# Altium footprint library Connector.PcbLib: 65 footprints (part 2 of 5)
Each footprint in its own frame and in the unit in brackets; x right, y up, seen from the top. Pads: shape width x height; smd on the part's side, far side on the other; paste and mask are expansions set on the pad; w line width, h text height; cw(c..) or ccw(c..) is an arc to the next point about the centre after c.
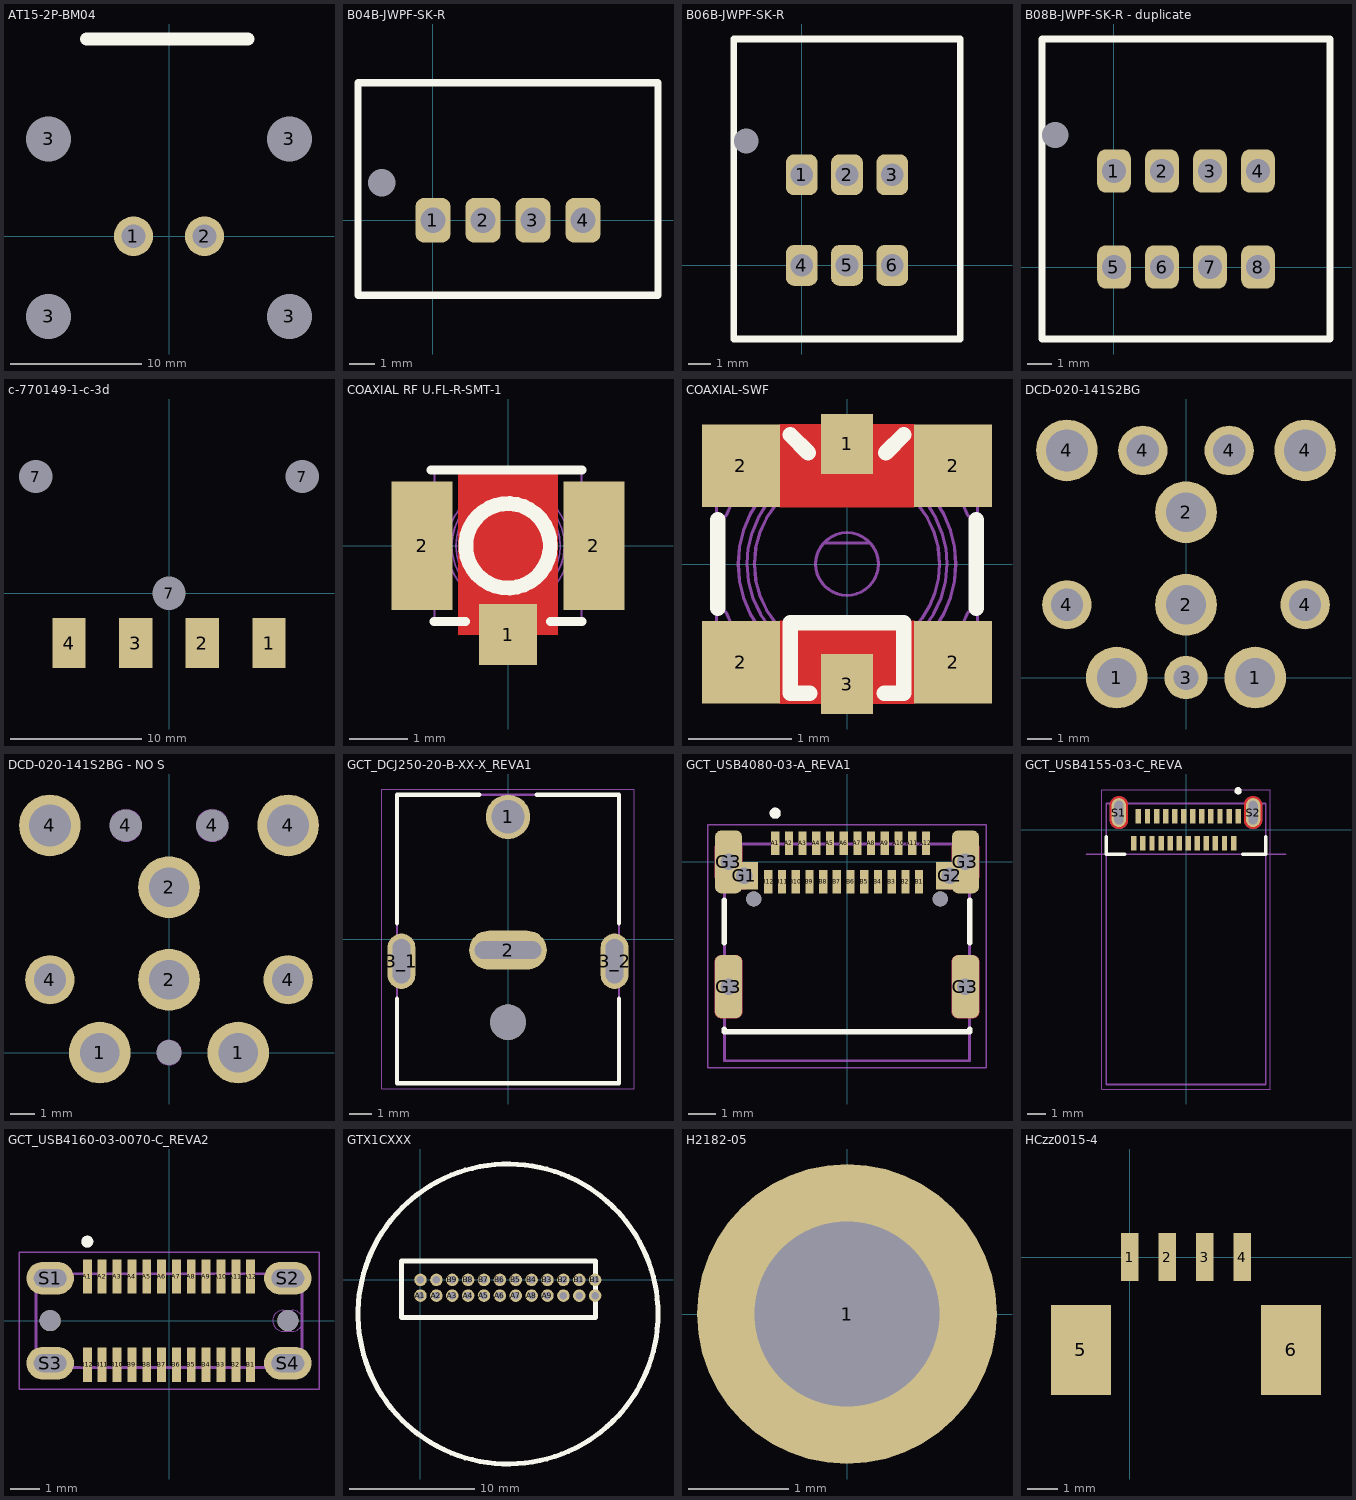
[diagram p1: the footprints below, top view; thin cyan lines are the x and y axes]

## AT15-2P-BM04 [mm] "2 POSITION STRAIGHT FLANGE MOUNT PCB RECEPTACLE, POTTED, TIN PLATED CONTACTS INCLUDED. COMPARABLE TO PN# DT15-2P-P010"
pads (6):
  round 3 hole 1.8: 1(-2.7,0) 2(2.7,0)
  round 3 hole 3.43 unplated: 3(-9.155,-6.1) 3(-9.155,7.41) 3(9.155,-6.1) 3(9.155,7.41)
Top Overlay:
  lines w1: -6.25,15 6,15
3D body "AT15-2P-BM04.stp": height 30.8, standoff -1.83, extent -17.591,-13.049 17.609,14.351

## B04B-JWPF-SK-R [mm] "JST 2x5 Automotive"
pads (5):
  rrect50% 1.4x1.8 hole 1: 1(0,0) 2(2,0) 3(4,0) 4(6,0)
  round 0 hole 1.1 unplated: 10(-2.05,1.5)
Top Overlay:
  lines w0.3: -3,-3 9,-3 9,5.5 -3,5.5 -3,-3
3D body "B04B-JWPF-SK-R.STEP": height 17, standoff -2.9, extent -2.501,-2.863 8.499,5.537

## B06B-JWPF-SK-R [mm] "JST 2x5 Automotive"
pads (7):
  rrect50% 1.4x1.8 hole 1: 1(0,4) 2(2,4) 3(4,4) 4(0,0) 5(2,0) 6(4,0)
  round 0 hole 1.1 unplated: 10(-2.45,5.5)
Top Overlay:
  lines w0.3: -3,-3.25 7,-3.25 7,10 -3,10 -3,-3.25
3D body "B06B-JWPF-SK-R.STEP": height 16.6, standoff -3.3, extent -2.879,-3.052 6.921,9.748

## B08B-JWPF-SK-R - duplicate [mm] "JST 2x5 Automotive"
pads (9):
  rrect50% 1.4x1.8 hole 1: 1(0,4) 2(2,4) 3(4,4) 4(6,4) 5(0,0) 6(2,0) 7(4,0) 8(6,0)
  round 0 hole 1.1 unplated: 10(-2.45,5.5)
Top Overlay:
  lines w0.3: -3,-3 -3,9.5 9,9.5 9,-3 -3,-3
3D body "B08B-JWPF-SK-R.STEP": height 16.6, standoff -3.3, extent -2.909,-3.037 8.891,9.463

## c-770149-1-c-3d [mil] "4 Pin drive power SMD"
pads (7):
  rect 100x150 smd: 1(300,-150) 2(100,-150) 3(-100,-150) 4(-300,-150)
  round 60 hole 100 unplated: 7(-400,350) 7(0,0) 7(400,350)
3D body "c-770149-1-c-3d.stp": height 347.6, standoff -165.4, extent -500,-201.4 500,403.54

## COAXIAL RF U.FL-R-SMT-1 [mm]
pads (3):
  rect 1x1.05 smd: 1(0,-1.525)
  rect 1.05x2.2 smd: 2(-1.475,0) 2(1.475,0)
Top Layer:
  pour cut-out: 0.85,1.3 -0.85,1.3 -0.85,-1.525 0.85,-1.525
Top Overlay:
  circle w0.254: c0,0 r0.725
  lines w0: 0.725,1.3 1.275,1.3
  lines w0.152: -1.325,1.3 1.275,1.3 ; -1.275,-1.3 -0.725,-1.3 ; 0.725,-1.3 1.275,-1.3
Mechanical 7:
  drawing of 206 lines, arcs and shapes, not listed
  text ".Designator" at 0,0 h0.38
3D body "U.FL-R-SMT-1.stp": height 1.25, standoff 0, extent -1.5,-1.6 1.5,1.5

## COAXIAL-SWF [mm]
pads (6):
  rect 0.5x0.58 smd: 1(0,1.16) 3(0,-1.16)
  rect 0.75x0.8 smd: 2(-1.025,-0.95) 2(-1.025,0.95) 2(1.025,-0.95) 2(1.025,0.95)
Top Layer:
  pour cut-out: -0.65,0.55 0.65,0.55 0.65,1.35 -0.65,1.35
  pour cut-out: 0.65,-0.55 -0.65,-0.55 -0.65,-1.35 0.65,-1.35
Top Overlay:
  lines w0.15: -1.25,-0.43 -1.25,0.43 ; -0.55,1.25 -0.375,1.075 ; -0.36,-1.25 -0.55,-1.25 -0.55,-0.57 0.55,-0.57 0.55,-1.25 0.36,-1.25 ; 0.375,1.075 0.55,1.25 ; 1.25,-0.43 1.25,0.43
Mechanical 7:
  drawing of 206 lines, arcs and shapes, not listed
3D body: height 1.55, standoff 1.25, extent -1.05,-1.05 1.05,1.05
3D body: height 1.25, standoff 0.95, extent -1.05,-1.049 1.05,1.05
3D body: height 0.9, standoff 0.6, extent -1.05,-1.049 1.05,1.05
3D body: height 0.55, standoff 0.1, extent -1.262,-1.252 1.262,1.253
3D body: height 0.6, standoff 0, extent -1.262,0.655 -0.757,1.248
3D body: height 0.6, standoff 0, extent -1.262,-1.25 -0.757,-0.649
3D body: height 0.6, standoff 0, extent 0.757,-1.246 1.262,-0.653
3D body: height 0.6, standoff 0, extent 0.757,0.655 1.262,1.249
3D body: height 0.95, standoff 0.75, extent -1,-0.999 1,1.001
3D body: height 0.75, standoff 0.6, extent -1.05,-1.049 1.05,1.05
3D body: height 1.4, standoff 0.6, extent -0.9,-0.9 0.9,0.901
3D body: height 0.6, standoff 0.55, extent -1.262,-1.248 1.262,1.251
3D body: height 0.15, standoff 0, extent -0.227,0.899 0.227,1.299
3D body: height 0.15, standoff 0, extent -0.227,-1.301 0.227,-0.758

## DCD-020-141S2BG [mm]
pads (11):
  round 2.5 hole 1.6: 1(-2.801,0) 1(2.802,0) 2(0,2.95) 2(0,6.7)
  round 1.75 hole 1: 3(0,0)
  round 2 hole 1.3: 4(-4.825,2.95) 4(-1.75,9.2) 4(1.75,9.2) 4(4.825,2.95)
  round 2.5 hole 1.7: 4(-4.825,9.2) 4(4.825,9.2)
Mechanical 1:
  circle w0.013: c4.825,9.2 r0.85
  circle w0.013: c-1.75,9.2 r0.65
  circle w0.013: c1.75,9.2 r0.65
  circle w0.013: c0,6.7 r0.8
  circle w0.013: c-2.801,0 r0.8
  circle w0.013: c0,0 r0.5
  circle w0.013: c2.802,0 r0.8
  circle w0.013: c4.825,2.95 r0.65
  circle w0.013: c-4.825,2.95 r0.65
  circle w0.013: c-4.825,9.2 r0.85
  circle w0.013: c0,2.95 r0.8
3D body "DCD-020-141S2.step": height 11, standoff -1.3, extent -5,-0.4 5,11.9

## DCD-020-141S2BG - NO S [mm]
pads (11):
  round 2.5 hole 1.6: 1(-2.801,0) 1(2.802,0) 2(0,2.95) 2(0,6.7)
  round 0 hole 1 unplated: 3(0,0)
  round 2 hole 1.3: 4(-4.825,2.95) 4(4.825,2.95)
  round 2.5 hole 1.7: 4(-4.825,9.2) 4(4.825,9.2)
  round 1 hole 1.3 unplated: 4(-1.75,9.2) 4(1.75,9.2)
Mechanical 1:
  circle w0.013: c4.825,9.2 r0.85
  circle w0.013: c-1.75,9.2 r0.65
  circle w0.013: c1.75,9.2 r0.65
  circle w0.013: c0,6.7 r0.8
  circle w0.013: c-2.801,0 r0.8
  circle w0.013: c0,0 r0.5
  circle w0.013: c2.802,0 r0.8
  circle w0.013: c4.825,2.95 r0.65
  circle w0.013: c-4.825,2.95 r0.65
  circle w0.013: c-4.825,9.2 r0.85
  circle w0.013: c0,2.95 r0.8
3D body "DCD-020-141S2.step": height 11, standoff -1.3, extent -5,-0.4 5,11.9

## GCT_DCJ250-20-B-XX-X_REVA1 [mm]
pads (5):
  round 2 hole 1.5: 1(0,5.5)
  oval 3.5x1.75 hole 0.8 slot 3 at 0 deg: 2(0,-0.5)
  oval 1.25x2.5 hole 0.8 slot 2 at 90 deg: 3_1(-4.8,-1) 3_2(4.8,-1)
  round 1.6 hole 1.6 unplated: ""(0,-3.75)
Top Overlay:
  lines w0.2: -5,-2.7 -5,-6.5 5,-6.5 5,-2.7 ; -5,0.7 -5,6.5 -1.3,6.5 ; 1.3,6.5 5,6.5 5,0.7
Mechanical 13:
  lines w0.1: -5,-6.5 -5,6.5 5,6.5 5,-6.5 -5,-6.5
Mechanical 15:
  lines w0.05: -5.68,-6.756 -5.68,6.756 5.68,6.756 5.68,-6.756 -5.68,-6.756
3D body "dcj250-20-b-k1-a.stp": height 10, standoff -2.2, extent -5.193,-6.6 5.2,6.4

## GCT_USB4080-03-A_REVA1 [mm]
height 3.16
pads (32):
  rect 0.3x0.85 smd: A1(-2.62,0.675) A2(-2.12,0.675) A3(-1.62,0.675) A4(-1.12,0.675) A5(-0.62,0.675) A6(-0.12,0.675) A7(0.38,0.675) A8(0.88,0.675) A9(1.38,0.675) A10(1.88,0.675) A11(2.38,0.675) A12(2.88,0.675) B1(2.63,-0.725) B2(2.13,-0.725) B3(1.63,-0.725) B4(1.13,-0.725) B5(0.63,-0.725) B6(0.13,-0.725) B7(-0.37,-0.725) B8(-0.87,-0.725) B9(-1.37,-0.725) B10(-1.87,-0.725) B11(-2.37,-0.725) B12(-2.87,-0.725)
  rect 1x1 hole 0.6 square: G1(-3.75,-0.5) G2(3.75,-0.5)
  rrect50% 1x2.3 hole 0.6 square: G3(-4.32,-4.55) G3(-4.32,0) G3(4.32,-4.55) G3(4.32,0)
  round 0.55 hole 0.55 unplated: ""(-3.4,-1.35) ""(3.4,-1.35)
Top Layer:
  region: 182 vertices and 0 holes, not listed, extent -4.82,-1 -3.28,1
  region: 180 vertices and 0 holes, not listed, extent 3.28,-1 4.82,0.99
  region: 4.596,-3.401 4.609,-3.403 4.622,-3.405 4.635,-3.409 4.647,-3.412 4.66,-3.417 4.672,-3.422 4.683,-3.427 4.695,-3.433 4.706,-3.44 4.717,-3.448 4.727,-3.456 4.737,-3.464 4.747,-3.473 4.756,-3.483 4.764,-3.493 4.772,-3.503 4.78,-3.514 4.787,-3.525 4.793,-3.537 4.798,-3.548 4.803,-3.56 4.808,-3.573 4.811,-3.585 4.815,-3.598 4.817,-3.611 4.819,-3.624 4.82,-3.637 4.82,-3.65 4.82,-5.45 4.82,-5.463 4.819,-5.476 4.817,-5.489 4.815,-5.502 4.811,-5.515 4.808,-5.527 4.803,-5.54 4.798,-5.552 4.793,-5.563 4.787,-5.575 4.78,-5.586 4.772,-5.597 4.764,-5.607 4.756,-5.617 4.747,-5.627 4.737,-5.636 4.727,-5.644 4.717,-5.652 4.706,-5.66 4.695,-5.667 4.683,-5.673 4.672,-5.678 4.66,-5.683 4.647,-5.688 4.635,-5.691 4.622,-5.695 4.609,-5.697 4.596,-5.699 4.583,-5.7 4.057,-5.7 4.044,-5.699 4.031,-5.697 4.018,-5.695 4.005,-5.691 3.993,-5.688 3.98,-5.683 3.968,-5.678 3.957,-5.673 3.945,-5.667 3.934,-5.66 3.923,-5.652 3.913,-5.644 3.903,-5.636 3.893,-5.627 3.884,-5.617 3.876,-5.607 3.868,-5.597 3.86,-5.586 3.853,-5.575 3.847,-5.563 3.842,-5.552 3.837,-5.54 3.832,-5.527 3.829,-5.515 3.825,-5.502 3.823,-5.489 3.821,-5.476 3.82,-5.463 3.82,-5.45 3.82,-3.65 3.82,-3.637 3.821,-3.624 3.823,-3.611 3.825,-3.598 3.829,-3.585 3.832,-3.573 3.837,-3.56 3.842,-3.548 3.847,-3.537 3.853,-3.525 3.86,-3.514 3.868,-3.503 3.876,-3.493 3.884,-3.483 3.893,-3.473 3.903,-3.464 3.913,-3.456 3.923,-3.448 3.934,-3.44 3.945,-3.433 3.957,-3.427 3.968,-3.422 3.98,-3.417 3.993,-3.412 4.005,-3.409 4.018,-3.405 4.031,-3.403 4.044,-3.401 4.057,-3.4 4.583,-3.4
  region: -4.044,-3.401 -4.031,-3.403 -4.018,-3.405 -4.005,-3.409 -3.993,-3.412 -3.98,-3.417 -3.968,-3.422 -3.957,-3.427 -3.945,-3.433 -3.934,-3.44 -3.923,-3.448 -3.913,-3.456 -3.903,-3.464 -3.893,-3.473 -3.884,-3.483 -3.876,-3.493 -3.868,-3.503 -3.86,-3.514 -3.853,-3.525 -3.847,-3.537 -3.842,-3.548 -3.837,-3.56 -3.832,-3.573 -3.829,-3.585 -3.825,-3.598 -3.823,-3.611 -3.821,-3.624 -3.82,-3.637 -3.82,-3.65 -3.82,-5.45 -3.82,-5.463 -3.821,-5.476 -3.823,-5.489 -3.825,-5.502 -3.829,-5.515 -3.832,-5.527 -3.837,-5.54 -3.842,-5.552 -3.847,-5.563 -3.853,-5.575 -3.86,-5.586 -3.868,-5.597 -3.876,-5.607 -3.884,-5.617 -3.893,-5.627 -3.903,-5.636 -3.913,-5.644 -3.923,-5.652 -3.934,-5.66 -3.945,-5.667 -3.957,-5.673 -3.968,-5.678 -3.98,-5.683 -3.993,-5.688 -4.005,-5.691 -4.018,-5.695 -4.031,-5.697 -4.044,-5.699 -4.057,-5.7 -4.583,-5.7 -4.596,-5.699 -4.609,-5.697 -4.622,-5.695 -4.635,-5.691 -4.647,-5.688 -4.66,-5.683 -4.672,-5.678 -4.683,-5.673 -4.695,-5.667 -4.706,-5.66 -4.717,-5.652 -4.727,-5.644 -4.737,-5.636 -4.747,-5.627 -4.756,-5.617 -4.764,-5.607 -4.772,-5.597 -4.78,-5.586 -4.787,-5.575 -4.793,-5.563 -4.798,-5.552 -4.803,-5.54 -4.808,-5.527 -4.811,-5.515 -4.815,-5.502 -4.817,-5.489 -4.819,-5.476 -4.82,-5.463 -4.82,-5.45 -4.82,-3.65 -4.82,-3.637 -4.819,-3.624 -4.817,-3.611 -4.815,-3.598 -4.811,-3.585 -4.808,-3.573 -4.803,-3.56 -4.798,-3.548 -4.793,-3.537 -4.787,-3.525 -4.78,-3.514 -4.772,-3.503 -4.764,-3.493 -4.756,-3.483 -4.747,-3.473 -4.737,-3.464 -4.727,-3.456 -4.717,-3.448 -4.706,-3.44 -4.695,-3.433 -4.683,-3.427 -4.672,-3.422 -4.66,-3.417 -4.647,-3.412 -4.635,-3.409 -4.622,-3.405 -4.609,-3.403 -4.596,-3.401 -4.583,-3.4 -4.057,-3.4
Bottom Layer:
  region: 182 vertices and 0 holes, not listed, extent -4.82,-1 -3.28,1
  region: 180 vertices and 0 holes, not listed, extent 3.28,-1 4.82,0.99
  region: -4.044,-3.401 -4.031,-3.403 -4.018,-3.405 -4.005,-3.409 -3.993,-3.412 -3.98,-3.417 -3.968,-3.422 -3.957,-3.427 -3.945,-3.433 -3.934,-3.44 -3.923,-3.448 -3.913,-3.456 -3.903,-3.464 -3.893,-3.473 -3.884,-3.483 -3.876,-3.493 -3.868,-3.503 -3.86,-3.514 -3.853,-3.525 -3.847,-3.537 -3.842,-3.548 -3.837,-3.56 -3.832,-3.573 -3.829,-3.585 -3.825,-3.598 -3.823,-3.611 -3.821,-3.624 -3.82,-3.637 -3.82,-3.65 -3.82,-5.45 -3.82,-5.463 -3.821,-5.476 -3.823,-5.489 -3.825,-5.502 -3.829,-5.515 -3.832,-5.527 -3.837,-5.54 -3.842,-5.552 -3.847,-5.563 -3.853,-5.575 -3.86,-5.586 -3.868,-5.597 -3.876,-5.607 -3.884,-5.617 -3.893,-5.627 -3.903,-5.636 -3.913,-5.644 -3.923,-5.652 -3.934,-5.66 -3.945,-5.667 -3.957,-5.673 -3.968,-5.678 -3.98,-5.683 -3.993,-5.688 -4.005,-5.691 -4.018,-5.695 -4.031,-5.697 -4.044,-5.699 -4.057,-5.7 -4.583,-5.7 -4.596,-5.699 -4.609,-5.697 -4.622,-5.695 -4.635,-5.691 -4.647,-5.688 -4.66,-5.683 -4.672,-5.678 -4.683,-5.673 -4.695,-5.667 -4.706,-5.66 -4.717,-5.652 -4.727,-5.644 -4.737,-5.636 -4.747,-5.627 -4.756,-5.617 -4.764,-5.607 -4.772,-5.597 -4.78,-5.586 -4.787,-5.575 -4.793,-5.563 -4.798,-5.552 -4.803,-5.54 -4.808,-5.527 -4.811,-5.515 -4.815,-5.502 -4.817,-5.489 -4.819,-5.476 -4.82,-5.463 -4.82,-5.45 -4.82,-3.65 -4.82,-3.637 -4.819,-3.624 -4.817,-3.611 -4.815,-3.598 -4.811,-3.585 -4.808,-3.573 -4.803,-3.56 -4.798,-3.548 -4.793,-3.537 -4.787,-3.525 -4.78,-3.514 -4.772,-3.503 -4.764,-3.493 -4.756,-3.483 -4.747,-3.473 -4.737,-3.464 -4.727,-3.456 -4.717,-3.448 -4.706,-3.44 -4.695,-3.433 -4.683,-3.427 -4.672,-3.422 -4.66,-3.417 -4.647,-3.412 -4.635,-3.409 -4.622,-3.405 -4.609,-3.403 -4.596,-3.401 -4.583,-3.4 -4.057,-3.4
  region: 4.596,-3.401 4.609,-3.403 4.622,-3.405 4.635,-3.409 4.647,-3.412 4.66,-3.417 4.672,-3.422 4.683,-3.427 4.695,-3.433 4.706,-3.44 4.717,-3.448 4.727,-3.456 4.737,-3.464 4.747,-3.473 4.756,-3.483 4.764,-3.493 4.772,-3.503 4.78,-3.514 4.787,-3.525 4.793,-3.537 4.798,-3.548 4.803,-3.56 4.808,-3.573 4.811,-3.585 4.815,-3.598 4.817,-3.611 4.819,-3.624 4.82,-3.637 4.82,-3.65 4.82,-5.45 4.82,-5.463 4.819,-5.476 4.817,-5.489 4.815,-5.502 4.811,-5.515 4.808,-5.527 4.803,-5.54 4.798,-5.552 4.793,-5.563 4.787,-5.575 4.78,-5.586 4.772,-5.597 4.764,-5.607 4.756,-5.617 4.747,-5.627 4.737,-5.636 4.727,-5.644 4.717,-5.652 4.706,-5.66 4.695,-5.667 4.683,-5.673 4.672,-5.678 4.66,-5.683 4.647,-5.688 4.635,-5.691 4.622,-5.695 4.609,-5.697 4.596,-5.699 4.583,-5.7 4.057,-5.7 4.044,-5.699 4.031,-5.697 4.018,-5.695 4.005,-5.691 3.993,-5.688 3.98,-5.683 3.968,-5.678 3.957,-5.673 3.945,-5.667 3.934,-5.66 3.923,-5.652 3.913,-5.644 3.903,-5.636 3.893,-5.627 3.884,-5.617 3.876,-5.607 3.868,-5.597 3.86,-5.586 3.853,-5.575 3.847,-5.563 3.842,-5.552 3.837,-5.54 3.832,-5.527 3.829,-5.515 3.825,-5.502 3.823,-5.489 3.821,-5.476 3.82,-5.463 3.82,-5.45 3.82,-3.65 3.82,-3.637 3.821,-3.624 3.823,-3.611 3.825,-3.598 3.829,-3.585 3.832,-3.573 3.837,-3.56 3.842,-3.548 3.847,-3.537 3.853,-3.525 3.86,-3.514 3.868,-3.503 3.876,-3.493 3.884,-3.483 3.893,-3.473 3.903,-3.464 3.913,-3.456 3.923,-3.448 3.934,-3.44 3.945,-3.433 3.957,-3.427 3.968,-3.422 3.98,-3.417 3.993,-3.412 4.005,-3.409 4.018,-3.405 4.031,-3.403 4.044,-3.401 4.057,-3.4 4.583,-3.4
Top Overlay:
  circle w0.2: c-2.62,1.775 r0.1
  lines w0.2: -4.47,-6.1 -4.47,-6.2 4.47,-6.2 4.47,-6.1 ; -4.47,-2.95 -4.47,-1.4 ; 4.47,-2.95 4.47,-1.4
Top Solder:
  drawing of 4 lines, arcs and shapes, not listed
Bottom Solder:
  drawing of 4 lines, arcs and shapes, not listed
Mechanical 1:
  lines w0: 4,-0.2 ccw(c4.005,-0.185) 4.02,-0.19 4.02,0.5 cw(c4.32,0.5) 4.32,0.8 cw(c4.32,0.5) 4.62,0.5 4.62,-0.5 cw(c4.32,-0.5) 4.32,-0.8 3.72,-0.8 cw(c3.72,-0.5) 3.42,-0.5 cw(c3.72,-0.5) 3.72,-0.2 4,-0.2 ; -4.62,-5.35 ccw(c-4.47,-5.35) -4.47,-5.5 -4.17,-5.5 ccw(c-4.17,-5.35) -4.02,-5.35 -4.02,-3.75 ccw(c-4.17,-3.75) -4.17,-3.6 -4.47,-3.6 ccw(c-4.47,-3.75) -4.62,-3.75 -4.62,-5.35 ; -4.62,-0.5 ccw(c-4.32,-0.5) -4.32,-0.8 -3.72,-0.8 ccw(c-3.72,-0.5) -3.42,-0.5 ccw(c-3.72,-0.5) -3.72,-0.2 -4,-0.2 cw(c-4,-0.18) -4.02,-0.18 -4.02,0.5 ccw(c-4.32,0.5) -4.32,0.8 ccw(c-4.32,0.5) -4.62,0.5 -4.62,-0.5 ; 4.02,-5.35 ccw(c4.17,-5.35) 4.17,-5.5 4.47,-5.5 ccw(c4.47,-5.35) 4.62,-5.35 4.62,-3.75 ccw(c4.47,-3.75) 4.47,-3.6 4.17,-3.6 ccw(c4.17,-3.75) 4.02,-3.75 4.02,-5.35
Mechanical 13:
  circle w0.2: c-2.62,1.775 r0.1
  lines w0.1: -4.47,-6.2 -4.47,0.65 4.47,0.65 4.47,-6.2 ; -4.47,-6.2 -4.47,-7.25 4.47,-7.25 4.47,-6.2 ; -4.47,-6.2 4.47,-6.2
Mechanical 15:
  lines w0.05: -5.07,-7.5 -5.07,1.35 5.07,1.35 5.07,-7.5 -5.07,-7.5
3D body "USB4080-03-A.stp": height 3.21, standoff -0.55, extent -4.47,-7.239 4.47,0.861

## GCT_USB4155-03-C_REVA [mm]
pads (26):
  rect 0.3x0.8 smd: A1(2.875,0.75) A2(2.375,0.75) A3(1.875,0.75) A4(1.375,0.75) A5(0.875,0.75) A6(0.375,0.75) A7(-0.125,0.75) A8(-0.625,0.75) A9(-1.125,0.75) A10(-1.625,0.75) A11(-2.125,0.75) A12(-2.625,0.75) B1(-2.875,-0.75) B2(-2.375,-0.75) B3(-1.875,-0.75) B4(-1.375,-0.75) B5(-0.875,-0.75) B6(-0.375,-0.75) B7(0.125,-0.75) B8(0.625,-0.75) B9(1.125,-0.75) B10(1.625,-0.75) B11(2.125,-0.75) B12(2.625,-0.75)
  oval 0.8x1.6 hole 0.5 slot 1.3 at 90 deg mask+0: S1(-3.7,0.95) S2(3.7,0.95)
Top Layer:
  region: -3.674,1.849 -3.648,1.847 -3.622,1.844 -3.596,1.839 -3.571,1.833 -3.545,1.826 -3.521,1.817 -3.497,1.807 -3.473,1.796 -3.45,1.783 -3.428,1.769 -3.406,1.755 -3.385,1.739 -3.365,1.722 -3.346,1.704 -3.328,1.685 -3.311,1.665 -3.295,1.644 -3.281,1.622 -3.267,1.6 -3.254,1.577 -3.243,1.553 -3.233,1.529 -3.224,1.505 -3.217,1.479 -3.211,1.454 -3.206,1.428 -3.203,1.402 -3.201,1.376 -3.2,1.35 -3.2,0.55 -3.201,0.524 -3.203,0.498 -3.206,0.472 -3.211,0.446 -3.217,0.421 -3.224,0.395 -3.233,0.371 -3.243,0.347 -3.254,0.323 -3.267,0.3 -3.281,0.278 -3.295,0.256 -3.311,0.235 -3.328,0.215 -3.346,0.196 -3.365,0.178 -3.385,0.161 -3.406,0.145 -3.428,0.131 -3.45,0.117 -3.473,0.104 -3.497,0.093 -3.521,0.083 -3.545,0.074 -3.571,0.067 -3.596,0.061 -3.622,0.056 -3.648,0.053 -3.674,0.051 -3.7,0.05 -3.726,0.051 -3.752,0.053 -3.778,0.056 -3.804,0.061 -3.829,0.067 -3.855,0.074 -3.879,0.083 -3.903,0.093 -3.927,0.104 -3.95,0.117 -3.972,0.131 -3.994,0.145 -4.015,0.161 -4.035,0.178 -4.054,0.196 -4.072,0.215 -4.089,0.235 -4.105,0.256 -4.119,0.278 -4.133,0.3 -4.146,0.323 -4.157,0.347 -4.167,0.371 -4.176,0.395 -4.183,0.421 -4.189,0.446 -4.194,0.472 -4.197,0.498 -4.199,0.524 -4.2,0.55 -4.2,1.35 -4.199,1.376 -4.197,1.402 -4.194,1.428 -4.189,1.454 -4.183,1.479 -4.176,1.505 -4.167,1.529 -4.157,1.553 -4.146,1.577 -4.133,1.6 -4.119,1.622 -4.105,1.644 -4.089,1.665 -4.072,1.685 -4.054,1.704 -4.035,1.722 -4.015,1.739 -3.994,1.755 -3.972,1.769 -3.95,1.783 -3.927,1.796 -3.903,1.807 -3.879,1.817 -3.855,1.826 -3.829,1.833 -3.804,1.839 -3.778,1.844 -3.752,1.847 -3.726,1.849 -3.7,1.85
  region: 3.726,1.849 3.752,1.847 3.778,1.844 3.804,1.839 3.829,1.833 3.855,1.826 3.879,1.817 3.903,1.807 3.927,1.796 3.95,1.783 3.972,1.769 3.994,1.755 4.015,1.739 4.035,1.722 4.054,1.704 4.072,1.685 4.089,1.665 4.105,1.644 4.119,1.622 4.133,1.6 4.146,1.577 4.157,1.553 4.167,1.529 4.176,1.505 4.183,1.479 4.189,1.454 4.194,1.428 4.197,1.402 4.199,1.376 4.2,1.35 4.2,0.55 4.199,0.524 4.197,0.498 4.194,0.472 4.189,0.446 4.183,0.421 4.176,0.395 4.167,0.371 4.157,0.347 4.146,0.323 4.133,0.3 4.119,0.278 4.105,0.256 4.089,0.235 4.072,0.215 4.054,0.196 4.035,0.178 4.015,0.161 3.994,0.145 3.972,0.131 3.95,0.117 3.927,0.104 3.903,0.093 3.879,0.083 3.855,0.074 3.829,0.067 3.804,0.061 3.778,0.056 3.752,0.053 3.726,0.051 3.7,0.05 3.674,0.051 3.648,0.053 3.622,0.056 3.596,0.061 3.571,0.067 3.545,0.074 3.521,0.083 3.497,0.093 3.473,0.104 3.45,0.117 3.428,0.131 3.406,0.145 3.385,0.161 3.365,0.178 3.346,0.196 3.328,0.215 3.311,0.235 3.295,0.256 3.281,0.278 3.267,0.3 3.254,0.323 3.243,0.347 3.233,0.371 3.224,0.395 3.217,0.421 3.211,0.446 3.206,0.472 3.203,0.498 3.201,0.524 3.2,0.55 3.2,1.35 3.201,1.376 3.203,1.402 3.206,1.428 3.211,1.454 3.217,1.479 3.224,1.505 3.233,1.529 3.243,1.553 3.254,1.577 3.267,1.6 3.281,1.622 3.295,1.644 3.311,1.665 3.328,1.685 3.346,1.704 3.365,1.722 3.385,1.739 3.406,1.755 3.428,1.769 3.45,1.783 3.473,1.796 3.497,1.807 3.521,1.817 3.545,1.826 3.571,1.833 3.596,1.839 3.622,1.844 3.648,1.847 3.674,1.849 3.7,1.85
Bottom Layer:
  region: -3.674,1.849 -3.648,1.847 -3.622,1.844 -3.596,1.839 -3.571,1.833 -3.545,1.826 -3.521,1.817 -3.497,1.807 -3.473,1.796 -3.45,1.783 -3.428,1.769 -3.406,1.755 -3.385,1.739 -3.365,1.722 -3.346,1.704 -3.328,1.685 -3.311,1.665 -3.295,1.644 -3.281,1.622 -3.267,1.6 -3.254,1.577 -3.243,1.553 -3.233,1.529 -3.224,1.505 -3.217,1.479 -3.211,1.454 -3.206,1.428 -3.203,1.402 -3.201,1.376 -3.2,1.35 -3.2,0.55 -3.201,0.524 -3.203,0.498 -3.206,0.472 -3.211,0.446 -3.217,0.421 -3.224,0.395 -3.233,0.371 -3.243,0.347 -3.254,0.323 -3.267,0.3 -3.281,0.278 -3.295,0.256 -3.311,0.235 -3.328,0.215 -3.346,0.196 -3.365,0.178 -3.385,0.161 -3.406,0.145 -3.428,0.131 -3.45,0.117 -3.473,0.104 -3.497,0.093 -3.521,0.083 -3.545,0.074 -3.571,0.067 -3.596,0.061 -3.622,0.056 -3.648,0.053 -3.674,0.051 -3.7,0.05 -3.726,0.051 -3.752,0.053 -3.778,0.056 -3.804,0.061 -3.829,0.067 -3.855,0.074 -3.879,0.083 -3.903,0.093 -3.927,0.104 -3.95,0.117 -3.972,0.131 -3.994,0.145 -4.015,0.161 -4.035,0.178 -4.054,0.196 -4.072,0.215 -4.089,0.235 -4.105,0.256 -4.119,0.278 -4.133,0.3 -4.146,0.323 -4.157,0.347 -4.167,0.371 -4.176,0.395 -4.183,0.421 -4.189,0.446 -4.194,0.472 -4.197,0.498 -4.199,0.524 -4.2,0.55 -4.2,1.35 -4.199,1.376 -4.197,1.402 -4.194,1.428 -4.189,1.454 -4.183,1.479 -4.176,1.505 -4.167,1.529 -4.157,1.553 -4.146,1.577 -4.133,1.6 -4.119,1.622 -4.105,1.644 -4.089,1.665 -4.072,1.685 -4.054,1.704 -4.035,1.722 -4.015,1.739 -3.994,1.755 -3.972,1.769 -3.95,1.783 -3.927,1.796 -3.903,1.807 -3.879,1.817 -3.855,1.826 -3.829,1.833 -3.804,1.839 -3.778,1.844 -3.752,1.847 -3.726,1.849 -3.7,1.85
  region: 3.726,1.849 3.752,1.847 3.778,1.844 3.804,1.839 3.829,1.833 3.855,1.826 3.879,1.817 3.903,1.807 3.927,1.796 3.95,1.783 3.972,1.769 3.994,1.755 4.015,1.739 4.035,1.722 4.054,1.704 4.072,1.685 4.089,1.665 4.105,1.644 4.119,1.622 4.133,1.6 4.146,1.577 4.157,1.553 4.167,1.529 4.176,1.505 4.183,1.479 4.189,1.454 4.194,1.428 4.197,1.402 4.199,1.376 4.2,1.35 4.2,0.55 4.199,0.524 4.197,0.498 4.194,0.472 4.189,0.446 4.183,0.421 4.176,0.395 4.167,0.371 4.157,0.347 4.146,0.323 4.133,0.3 4.119,0.278 4.105,0.256 4.089,0.235 4.072,0.215 4.054,0.196 4.035,0.178 4.015,0.161 3.994,0.145 3.972,0.131 3.95,0.117 3.927,0.104 3.903,0.093 3.879,0.083 3.855,0.074 3.829,0.067 3.804,0.061 3.778,0.056 3.752,0.053 3.726,0.051 3.7,0.05 3.674,0.051 3.648,0.053 3.622,0.056 3.596,0.061 3.571,0.067 3.545,0.074 3.521,0.083 3.497,0.093 3.473,0.104 3.45,0.117 3.428,0.131 3.406,0.145 3.385,0.161 3.365,0.178 3.346,0.196 3.328,0.215 3.311,0.235 3.295,0.256 3.281,0.278 3.267,0.3 3.254,0.323 3.243,0.347 3.233,0.371 3.224,0.395 3.217,0.421 3.211,0.446 3.206,0.472 3.203,0.498 3.201,0.524 3.2,0.55 3.2,1.35 3.201,1.376 3.203,1.402 3.206,1.428 3.211,1.454 3.217,1.479 3.224,1.505 3.233,1.529 3.243,1.553 3.254,1.577 3.267,1.6 3.281,1.622 3.295,1.644 3.311,1.665 3.328,1.685 3.346,1.704 3.365,1.722 3.385,1.739 3.406,1.755 3.428,1.769 3.45,1.783 3.473,1.796 3.497,1.807 3.521,1.817 3.545,1.826 3.571,1.833 3.596,1.839 3.622,1.844 3.648,1.847 3.674,1.849 3.7,1.85
Top Overlay:
  circle w0.2: c2.875,2.15 r0.1
  lines w0.2: -4.4,-0.4 -4.4,-1.35 -3.375,-1.35 ; 3.125,-1.35 4.4,-1.35 4.4,-0.4
Top Solder:
  drawing of 2 lines, arcs and shapes, not listed
Bottom Solder:
  drawing of 2 lines, arcs and shapes, not listed
Mechanical 13:
  circle w0.2: c2.875,2.15 r0.1
  lines w0.1: -5.5,-1.35 5.5,-1.35 ; -4.4,-14.05 -4.4,1.45 4.4,1.45 4.4,-14.05 -4.4,-14.05
  text "PCB Edge" at 5,-1.1 h0.81
Mechanical 15:
  lines w0.05: -4.65,-14.3 -4.65,2.2 4.65,2.2 4.65,-14.3 -4.65,-14.3
3D body "USB4155-03-C--3DModel-STEP-1.STEP": height 1.6, standoff -1.3, extent -4.4,-14.05 4.4,1.45

## GCT_USB4160-03-0070-C_REVA2 [mm]
height 7.66
pads (30):
  rect 0.3x1.15 smd: A1(-2.75,1.485) A2(-2.25,1.485) A3(-1.75,1.485) A4(-1.25,1.485) A5(-0.75,1.485) A6(-0.25,1.485) A7(0.25,1.485) A8(0.75,1.485) A9(1.25,1.485) A10(1.75,1.485) A11(2.25,1.485) A12(2.75,1.485) B1(2.75,-1.485) B2(2.25,-1.485) B3(1.75,-1.485) B4(1.25,-1.485) B5(0.75,-1.485) B6(0.25,-1.485) B7(-0.25,-1.485) B8(-0.75,-1.485) B9(-1.25,-1.485) B10(-1.75,-1.485) B11(-2.25,-1.485) B12(-2.75,-1.485)
  oval 1.6x1.1 hole 0.6 slot 1.1 at 0 deg: S1(-4,1.43) S2(4,1.43) S3(-4,-1.43) S4(4,-1.43)
  round 0.71 hole 0.71 unplated: ""(-4,0) ""(4,0)
Top Overlay:
  circle w0.2: c-2.75,2.66 r0.1
Mechanical 1:
  lines w0: 3.495,0 ccw(c3.85,0) 3.85,-0.355 4.15,-0.355 ccw(c4.15,0) 4.505,0 ccw(c4.15,0) 4.15,0.355 3.85,0.355 ccw(c3.85,0) 3.495,0
Mechanical 13:
  circle w0.2: c-2.75,2.66 r0.1
  lines w0.1: -4.47,-1.58 -4.47,1.58 4.47,1.58 4.47,-1.58 -4.47,-1.58
Mechanical 15:
  lines w0.05: -5.05,-2.31 -5.05,2.31 5.05,2.31 5.05,-2.31 -5.05,-2.31
3D body "USB4160-03-0070-C.stp": height 7.46, standoff -0.7, extent -4.475,-1.805 4.47,1.885

## GTX1CXXX [mm] "USB-C connector waterproof"
pads (24):
  round 1 hole 0.6: A1(0,-1.27) A2(1.27,-1.27) A3(2.54,-1.27) A4(3.81,-1.27) A5(5.08,-1.27) A6(6.35,-1.27) A7(7.62,-1.27) A8(8.89,-1.27) A9(10.16,-1.27) A10(11.43,-1.27) A11(12.7,-1.27) A11(13.97,-1.27) B1(12.7,0) B1(13.97,0) B2(11.43,0) B3(10.16,0) B4(8.89,0) B5(7.62,0) B6(6.35,0) B7(5.08,0) B8(3.81,0) B9(2.54,0) B10(1.27,0) B11(0,0)
Top Overlay:
  circle w0.4: c7,-2.735 r12
  lines w0.4: -1.5,-3 -1.5,1.5 14,1.5 14,-3 -1.5,-3

## H2182-05 [mm] "Male Vertical Throughboard Terminal Pin, ï¿½1.75mm 8.1mm"
pads (1):
  round 3 hole 1.85: 1(0,0)
3D body "h2182-05.stp": height 8.45, standoff -2, extent -1.125,-1.125 1.125,1.125

## HCzz0015-4 [mm] "1.25mm vertical 4p picoblade"
pads (6):
  rect 0.6x1.6 smd: 1(0,0) 2(1.25,0) 3(2.5,0) 4(3.75,0)
  rect 2x3 smd: 5(-1.625,-3.1) 6(5.375,-3.1)
3D body: height 4.7, standoff 0, extent -1.75,-4.25 5.75,0